# Altium footprint library Library.PcbLib: 308 footprints (part 20 of 21)
Each footprint in its own frame and in the unit in brackets; x right, y up, seen from the top. Pads: shape width x height; smd on the part's side, far side on the other; paste and mask are expansions set on the pad; w line width, h text height; cw(c..) or ccw(c..) is an arc to the next point about the centre after c.
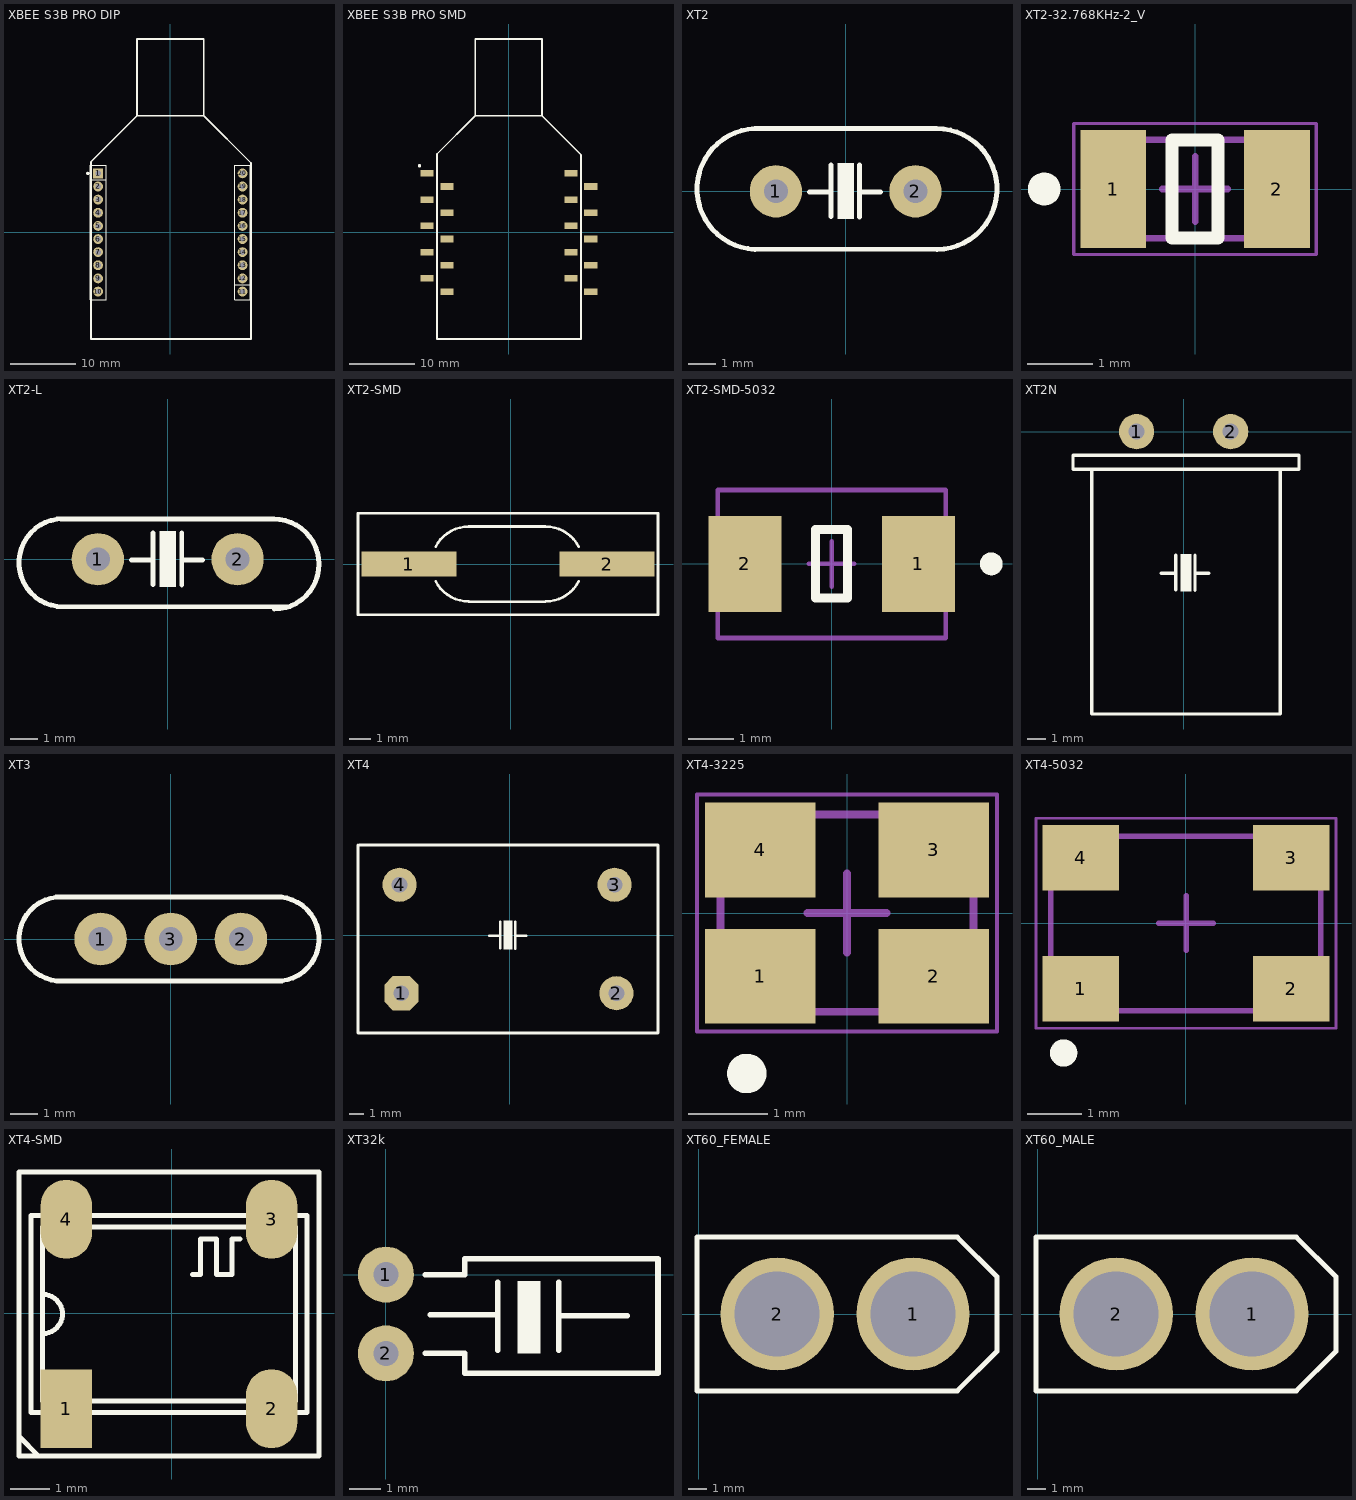
[diagram p19: the footprints below, top view; thin cyan lines are the x and y axes]

## XBEE S3B PRO DIP [mm]
pads (20):
  rect 1.5x1.5 hole 0.8: 1(-11,9)
  round 1.5 hole 0.8: 2(-11,7) 3(-11,5) 4(-11,3) 5(-11,1) 6(-11,-1) 7(-11,-3) 8(-11,-5) 9(-11,-7) 10(-11,-9) 11(11,-9) 12(11,-7) 13(11,-5) 14(11,-3) 15(11,-1) 16(11,1) 17(11,3) 18(11,5) 19(11,7) 20(11,9)
Top Overlay:
  circle w0.25: c-12.582,9 r0.125
  lines w0.127: -12.2,8 -9.8,8 ; 9.8,-8 12.2,-8 ; -12.2,-10.25 -12.2,10.25 -9.8,10.25 -9.8,-10.25 -12.2,-10.25 ; 9.8,-10.25 9.8,10.25 12.2,10.25 12.2,-10.25 9.8,-10.25
  lines w0.254: -5.08,17.78 5.08,17.78 ; -5.08,17.78 -12.091,10.769 -12.091,-16.228 12.293,-16.228 12.293,10.567 5.08,17.78 ; -5.08,17.78 -5.08,29.464 5.08,29.464 5.08,17.78
3D body "User Library-XbeePro-SMA.STEP": height 12.05, standoff 0.67, extent -12.091,-16.228 12.293,29.415
3D body "62001011821.stp": height 4.31, standoff -2.39, extent 9.8,-10.25 12.2,10.25
3D body "62001011821.stp": height 4.31, standoff -2.39, extent -12.2,-10.25 -9.8,10.25

## XBEE S3B PRO SMD [mm]
pads (20):
  rect 2x1 smd: 1(-12.422,9) 2(-9.422,7) 3(-12.422,5) 4(-9.422,3) 5(-12.422,1) 6(-9.422,-1) 7(-12.422,-3) 8(-9.422,-5) 9(-12.422,-7) 10(-9.422,-9) 11(12.5,-9) 12(9.5,-7) 13(12.5,-5) 14(9.5,-3) 15(12.5,-1) 16(9.5,1) 17(12.5,3) 18(9.5,5) 19(12.5,7) 20(9.5,9)
Top Overlay:
  circle w0.254: c-13.589,10.16 r0.127
  lines w0.254: -5.08,17.78 -5.08,29.464 5.08,29.464 5.08,17.78 ; -5.08,17.78 -10.922,11.938 -10.922,-16.228 11.006,-16.228 11.006,11.854 5.08,17.78 ; -5.08,17.78 5.08,17.78
3D body "User Library-XbeePro-SMA.STEP": height 12.05, standoff 0.67, extent -12.091,-16.228 12.293,29.415
3D body "female_header_a-bl200-eg-g10mp1.stp": height 4.5, standoff 0, extent -12.972,-10.25 -8.872,10.25
3D body "female_header_a-bl200-eg-g10mp1.stp": height 4.5, standoff 0, extent 8.95,-10.25 13.05,10.25

## XT2 [mil] "Footpin for Crystal 2 pin"
pads (2):
  round 75 hole 34: 1(-100,0) 2(100,0)
Top Overlay:
  region: 11.5,40 11.5,-39 -11.5,-39 -11.5,40
  lines w7: -135,-82.99 130,-82.99 ; -130,-83.09 cw(c-126.52,3.46) -130,90 130,90 cw(c130.27,3.39) 130.84,-83.23 ; -52,-1 -21,-1 ; -21,-36 -21,38 ; 20,-37 20,38 ; 20,-1 50,-1
3D body "User Library-HC49S-1.STEP": height 143.7, standoff -116.14, extent -216.14,-86.81 216.14,90

## XT2-32.768KHz-2_V [mm] "Hand Drawn, 2-Leads, Body 3.2x1.5mm, Pitch 2.5mm"
height 0.9
pads (2):
  rect 1x1.8 smd: 1(-1.25,0) 2(1.25,0)
Top Overlay:
  circle w0.25: c-2.3,0 r0.125
  lines w0.2: -0.35,-0.75 -0.35,0.75 0.35,0.75 0.35,-0.75 -0.35,-0.75
Mechanical 13:
  lines w0.1: -1.6,-0.75 1.6,-0.75 1.6,0.75 -1.6,0.75 -1.6,-0.75
Mechanical 15:
  lines w0.05: -1.85,-1 -1.85,1 1.85,1 1.85,-1 -1.85,-1
  lines w0.1: -0.5,0 0.5,0 ; 0,-0.5 0,0.5
3D body: height 0.9, standoff 0, extent -1.6,-0.75 1.6,0.75

## XT2-L [mil] "Footpin for Crystal 2 pin"
pads (2):
  round 75 hole 34: 1(-100,0) 2(100,0)
Top Overlay:
  region: 11.5,40 11.5,-39 -11.5,-39 -11.5,40
  lines w7: -152.59,57.53 152.1,57.53 ; -150,57.99 ccw(c-150,-5) -150,-67.99 175,-67.99 ; -52,-1 -21,-1 ; -21,-36 -21,38 ; 20,-37 20,38 ; 20,-1 50,-1 ; 151.9,57.53 cw(c152.1,-7) 152.52,-71.53
3D body "CircuitWorks-XTAL1.step": height 460, standoff -100, extent -210,-65 210,55

## XT2-SMD [mm]
pads (2):
  rect 4.5x1.2 smd: 1(-4.826,0) 2(4.572,0)
Top Overlay:
  lines w0.127: -3.556,-0.825 ccw(c-1.981,0) -1.981,-1.778 ; -3.556,0.825 cw(c-1.981,0) -1.981,1.778 ; -1.956,1.778 1.651,1.778 cw(c1.651,0) 3.226,0.825 ; -1.93,-1.787 1.626,-1.787 ; 1.651,-1.778 ccw(c1.651,0) 3.226,-0.825 ; -7.239,-2.413 -7.239,2.413 6.985,2.413 6.985,-2.413 -7.239,-2.413
3D body: height 4.3, standoff 0, extent -6.527,-2.415 6.273,2.415
3D body: height 0.25, standoff 0, extent -4.534,-0.419 -3.213,0.394
3D body: height 0.25, standoff 0, extent 2.832,-0.419 4.153,0.394

## XT2-SMD-5032 [mm]
pads (2):
  rect 1.6x2.1 smd: 1(1.9,0) 2(-1.9,0)
Top Overlay:
  circle w0.25: c3.5,0 r0.125
  lines w0.2: -0.35,-0.75 0.35,-0.75 0.35,0.75 -0.35,0.75 -0.35,-0.75
Mechanical 13:
  lines w0.1: -2.496,-1.625 2.5,-1.625 2.5,1.619 -2.496,1.619 -2.496,-1.625
Mechanical 15:
  lines w0.05: -2.496,-1.625 2.5,-1.625 2.5,1.6 -2.496,1.6 -2.496,-1.625
  lines w0.1: -0.5,0 0.5,0 ; 0,-0.5 0,0.5
3D body "User Library-5032_2.STEP": height 1.2, standoff -0.01, extent -2.5,-1.6 2.5,1.6

## XT2N [mil] "Crystal 2pin, high 200 mil"
height 200
pads (2):
  round 75 hole 34: 1(-100,0) 2(100,0)
Top Overlay:
  region: 16.5,-260 16.5,-339 -6.5,-339 -6.5,-260
  lines w7: -48,-301 -17,-301 ; -17,-336 -17,-262 ; 24,-337 24,-262 ; 24,-301 54,-301 ; -235,-80 -195,-80 ; -235,-80 -235,-50 ; -235,-80 -195,-80 ; -235,-80 -235,-50 ; -235,-50 245,-50 ; -235,-50 245,-50 ; -195,-600 -195,-80 ; -195,-600 205,-600 ; -195,-600 -195,-80 ; -195,-600 205,-600 ; -195,-80 205,-80 ; -195,-80 205,-80 ; 205,-600 205,-80 ; 205,-600 205,-80 ; 205,-80 245,-80 ; 205,-80 245,-80 ; 245,-80 245,-50 ; 245,-80 245,-50
3D body "User Library-MCCOY_R60.step": height 132.28, standoff 0, extent -145.99,-432.49 156.37,32.51
3D body "SW3dPS-HC49U.STEP": height 91.44, standoff -92.52, extent -209.86,-594.33 230,14.33

## XT3 [mil]
pads (3):
  round 75 hole 34: 1(-100,0) 2(100,0) 3(0,0)
Top Overlay:
  lines w7: 149.38,59.95 cw(c151.36,-0.02) 150,-60 -154.38,-59.95 cw(c-156.36,0.02) -155,60 149.38,60
3D body "User Library-XTAL2.step": height 126.52, standoff -95.28, extent -212,-60 208,60

## XT4 [mm]
pads (4):
  oct 2.4x2.4 hole 1.1: 1(-7.62,-4.064)
  round 2.4 hole 1.1: 2(7.493,-4.064) 3(7.366,3.556) 4(-7.747,3.556)
Top Overlay:
  region: 0.165,1.016 0.165,-0.991 -0.419,-0.991 -0.419,1.016
  lines w0.178: -1.448,-0.025 -0.66,-0.025 ; -0.66,-0.914 -0.66,0.965 ; 0.381,-0.94 0.381,0.965 ; 0.381,-0.025 1.143,-0.025
  lines w0.2: -10.668,6.35 -10.668,-6.858 10.414,-6.858 10.414,6.35 -10.541,6.35
3D body "User Library-osilator.step": height 7.27, standoff -5, extent -10.527,-6.794 10.273,6.286

## XT4-3225 [mm] "Hand Drawn, 4-Leads, Body 3.2x2.5 mm"
height 0.9
pads (4):
  rect 1.4x1.2 smd: 1(-1.1,-0.8) 2(1.1,-0.8) 3(1.1,0.8) 4(-1.1,0.8)
Top Overlay:
  circle w0.25: c-1.27,-2.032 r0.125
Mechanical 13:
  lines w0.1: -1.6,-1.25 1.6,-1.25 1.6,1.25 -1.6,1.25 -1.6,-1.25
Mechanical 15:
  lines w0.05: -1.9,-1.5 1.9,-1.5 1.9,1.5 -1.9,1.5 -1.9,-1.5
  lines w0.1: -0.5,0 0.5,0 ; 0,-0.5 0,0.5
3D body: height 0.9, standoff 0, extent -1.6,-1.25 1.6,1.25

## XT4-5032 [mm] "Hand Drawn, 4-Leads, Body 5x3.2 mm"
pads (4):
  rect 1.4x1.2 smd: 1(-1.925,-1.2) 2(1.925,-1.2) 3(1.925,1.2) 4(-1.925,1.2)
Top Overlay:
  circle w0.25: c-2.24,-2.374 r0.125
Mechanical 13:
  lines w0.1: -2.472,-1.6 2.468,-1.6 2.468,1.597 -2.472,1.597 -2.472,-1.6
Mechanical 15:
  lines w0.05: -2.746,-1.923 2.748,-1.923 2.748,1.923 -2.746,1.923 -2.746,-1.923
  lines w0.1: -0.5,0 0.5,0 ; 0.003,-0.497 0.003,0.503
3D body "User Library-Crystal_SMD5032.STEP": height 0.85, standoff -0.01, extent -2.475,-1.6 2.468,1.6

## XT4-SMD [mm]
pads (4):
  rect 1.3x2 smd: 1(-2.667,-2.413)
  oval 1.3x2 smd: 2(2.533,-2.413) 3(2.533,2.387) 4(-2.667,2.387)
Top Overlay:
  lines w0.127: -3.867,-3.313 -3.867,-3.113 -3.367,-3.613 -3.267,-3.613 ; -3.267,-0.513 ccw(c-3.267,-0.013) -3.267,0.487 ; 0.533,0.987 0.733,0.987 0.733,1.887 1.133,1.887 1.133,0.987 1.533,0.987 1.533,1.887 1.733,1.887 ; -3.867,-3.613 0.833,-3.613 3.733,-3.613 3.733,3.587 -3.867,3.587 -3.867,-3.613 ; -3.567,-2.513 -3.567,2.487 3.433,2.487 3.433,-2.513 -3.567,-2.513 ; -3.267,-2.213 -3.267,2.187 3.133,2.187 3.133,-2.213 -3.267,-2.213
3D body: height 2.03, standoff 1.3, extent -3.048,-1.905 2.921,1.905
3D body: height 1.3, standoff 1.27, extent -3.175,-2.032 3.048,2.032
3D body: height 1.3, standoff 0, extent 2.081,-2.502 2.996,-2.121
3D body: height 1.3, standoff 0, extent -3.119,-2.503 -2.204,-1.778
3D body: height 1.3, standoff 0, extent -3.13,2.095 -2.215,2.476
3D body: height 1.3, standoff 0, extent 2.07,2.095 2.984,2.476
3D body: height 1.27, standoff 0, extent -3.581,-2.489 3.429,2.464

## XT32k [mm]
pads (2):
  round 1.8 hole 0.813: 1(0,0) 2(0,-2.54)
Top Overlay:
  rectangle: 4.242,-2.54 4.978,-0.203
  lines w0.178: 1.27,-2.54 2.54,-2.54 2.54,-3.175 8.763,-3.175 8.763,0.508 2.54,0.508 2.54,0 1.27,0 ; 1.422,-1.295 3.607,-1.295 ; 3.607,-2.438 3.607,-0.254 ; 5.563,-2.438 5.563,-0.254 ; 5.588,-1.321 7.772,-1.321
3D body "User Library-KX-26.step": height 1.95, standoff -2, extent -0.145,-2.42 8.205,-0.12

## XT60_FEMALE [mm]
pads (2):
  round 6 hole 4.5: 1(11.35,0) 2(4.15,0)
Top Overlay:
  lines w0.254: -0.1,-4.075 13.705,-4.075 15.8,-1.98 15.8,1.98 13.705,4.075 -0.1,4.075 -0.1,-4.075
3D body "User Library-XT60 female.step": height 18, standoff -4.2, extent -0.1,-4.075 15.8,4.075

## XT60_MALE [mm]
pads (2):
  round 6 hole 4.5: 1(11.35,0) 2(4.15,0)
Top Overlay:
  lines w0.254: -0.1,-4.075 13.705,-4.075 15.8,-1.98 15.8,1.98 13.705,4.075 -0.1,4.075 -0.1,-4.075
3D body "User Library-XT60 male.step": height 17, standoff -4.2, extent -0.1,-4.075 15.8,4.075